# Altium schematic symbol library 13-Logicold 逻辑 IC.SchLib: 297 symbols (part 6 of 30) (continued)
## CY62167EV30LL-45ZXI (continued)
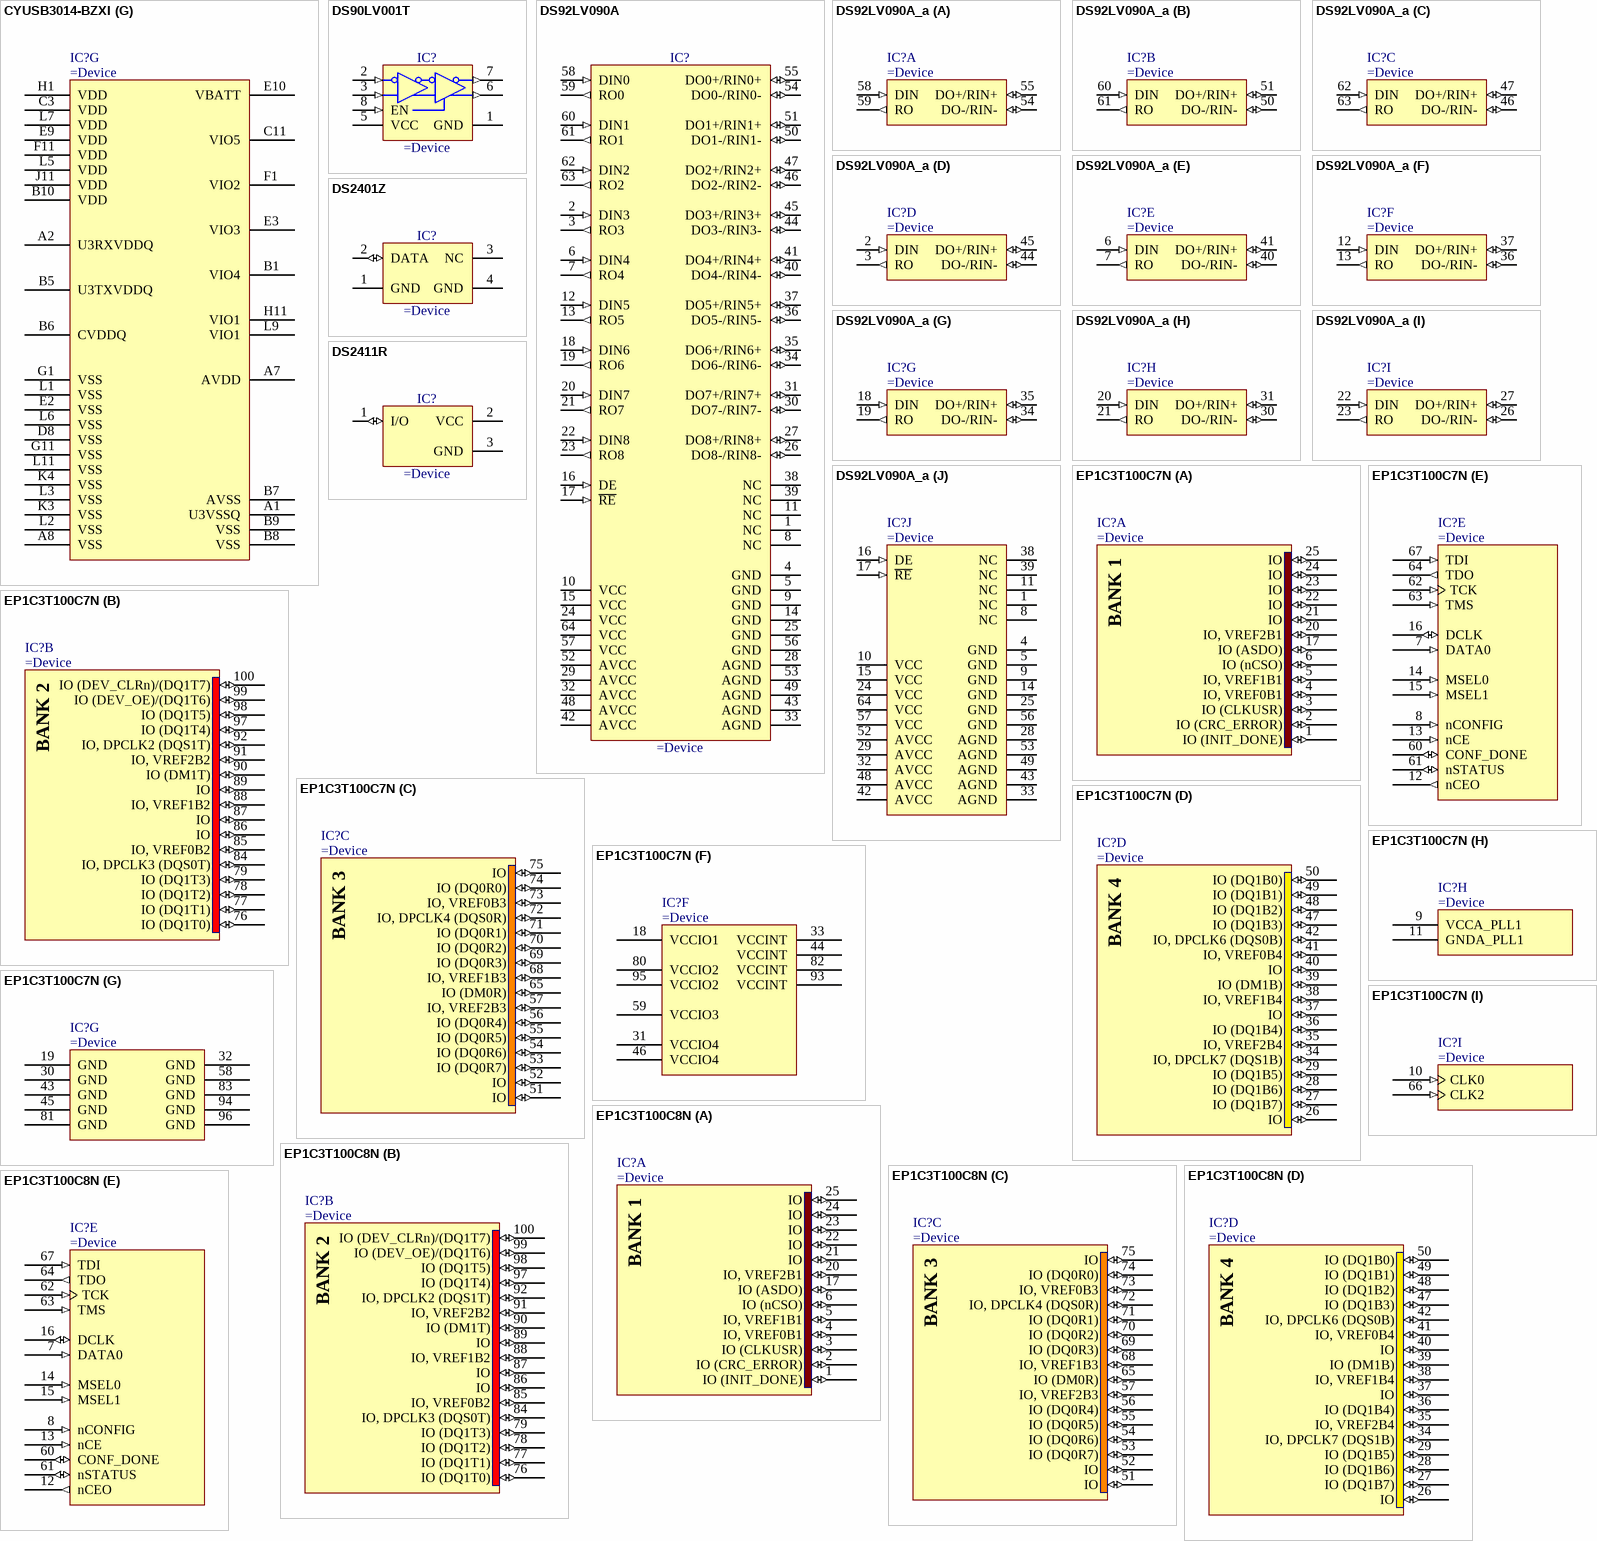
[diagram p34: symbols CYUSB3014-BZXI to EP1C3T100C8N]

## CYUSB3014-BZXI
designator IC?
EZ-USB® FX3 SuperSpeed USB Controller
part A pins: C5 ~{RESET} (in), F7 DQ2 (io), F8 DQ5 (io), F9 DQ1 (io), F10 DQ0 (io), G4 PMODE0 (io), G5 CTL8 (io), G6 CTL5 (io), G7 CTL4 (io), G8 DQ15 (io), G9 DQ4 (io), G10 DQ3 (io), H4 PMODE1 (io), H5 CTL12 (io), H6 CTL9 (io), H7 CTL3 (io), H8 CTL7 (io), H9 DQ7 (io), H10 DQ6 (io), J5 CTL11 (io), J6 PCLK (io), J7 CTL2 (io), J8 DQ14 (io), J9 DQ9 (io), J10 DQ8 (io), K5 CTL10 (io), K6 CTL6 (io), K7 CTL1 (io), K8 CTL0 (io), K9 DQ13 (io), K10 DQ12 (io), K11 DQ10 (io), L4 PMODE2 (io), L8 ~{INT}/CTL15 (io), L10 DQ11 (io)
part B pins: F2 GPIO45 (io), F3 DQ27 (io), F4 DQ24 (io), G2 DQ25 (io), G3 DQ26 (io), H2 DQ22 (io), H3 DQ23 (io), J1 DQ21 (io), J2 DQ19 (io), J3 DQ20 (io), J4 DQ17 (io), K1 DQ18 (io), K2 DQ16 (io)
part C pins: C1 UART_CTS/SPI_SSN (io), C2 UART_TX/SPI_MISO (io), C4 I2S_MCLK (io), D1 I2S_CLK (io), D2 I2S_SD (io), D3 I2S_WS (io), D4 UART_RTS/SPI_SCK (io), D5 UART_RX/SPI_MOSI (io), E1 DQ29 (io), E4 DQ31 (io), E5 DQ30 (io), F5 DQ28 (io)
part D pins: A3 SSRX- (in), A4 SSRX+ (in), A5 SSTX+ (out), A6 SSTX- (out), A9 D+ (io), A10 D- (io), A11 NC, B3 R_USB3 (io), C8 R_USB2 (io), C9 OTG_ID (in), E11 VBUS (power)
part E pins: B2 FSLC0 (in), B4 FSLC1 (in), C6 XTALIN (io), C7 XTALOUT (io), D6 CLKIN_32 (in), D7 CLKIN (in), E6 FSLC2 (in)
part F pins: B11 ~{TRST} (in), C10 TDO (out), D9 I2C_SCL (io), D10 I2C_SDA (io), D11 CHARGER-DET-OUT (io), E7 TDI (in), E8 TMS (in), F6 TCK (in)
part G pins: A1 U3VSSQ (power), A2 U3RXVDDQ (power), A7 AVDD (power), A8 VSS (power), B1 VIO4 (power), B5 U3TXVDDQ (power), B6 CVDDQ (power), B7 AVSS (power), B8 VSS (power), B9 VSS (power), B10 VDD (power), C3 VDD (power), C11 VIO5 (power), D8 VSS (power), E2 VSS (power), E3 VIO3 (power), E9 VDD (power), E10 VBATT (power), F1 VIO2 (power), F11 VDD (power), G1 VSS (power), G11 VSS (power), H1 VDD (power), H11 VIO1 (power), J11 VDD (power), K3 VSS (power), K4 VSS (power), L1 VSS (power), L2 VSS (power), L3 VSS (power), L5 VDD (power), L6 VSS (power), L7 VDD (power), L9 VIO1 (power), L11 VSS (power)

## DS90LV001T
designator IC?
800 Mbps LVDS Buffer
pins: 1 GND (power), 2 IN- (in), 3 IN+ (in), 5 VCC (power), 6 OUT+ (out), 7 OUT- (out), 8 EN (in)

## DS92LV090A
designator IC?
9 Channel Bus LVDS Transceiver
pins: 1 NC, 2 DIN3 (in), 3 RO3 (out), 4 GND (power), 5 GND (power), 6 DIN4 (in), 7 RO4 (out), 8 NC, 9 GND (power), 10 VCC (power), 11 NC, 12 DIN5 (in), 13 RO5 (out), 14 GND (power), 15 VCC (power), 16 DE (in), 17 ~{RE} (in), 18 DIN6 (in), 19 RO6 (out), 20 DIN7 (in), 21 RO7 (out), 22 DIN8 (in), 23 RO8 (out), 24 VCC (power), 25 GND (power), 26 DO8-/RIN8- (io), 27 DO8+/RIN8+ (io), 28 AGND (power), 29 AVCC (power), 30 DO7-/RIN7- (io), 31 DO7+/RIN7+ (io), 32 AVCC (power), 33 AGND (power), 34 DO6-/RIN6- (io), 35 DO6+/RIN6+ (io), 36 DO5-/RIN5- (io), 37 DO5+/RIN5+ (io), 38 NC, 39 NC, 40 DO4-/RIN4- (io), 41 DO4+/RIN4+ (io), 42 AVCC (power), 43 AGND (power), 44 DO3-/RIN3- (io), 45 DO3+/RIN3+ (io), 46 DO2-/RIN2- (io), 47 DO2+/RIN2+ (io), 48 AVCC (power), 49 AGND (power), 50 DO1-/RIN1- (io), 51 DO1+/RIN1+ (io), 52 AVCC (power), 53 AGND (power), 54 DO0-/RIN0- (io), 55 DO0+/RIN0+ (io), 56 GND (power), 57 VCC (power), 58 DIN0 (in), 59 RO0 (out), 60 DIN1 (in), 61 RO1 (out), 62 DIN2 (in), 63 RO2 (out), 64 VCC (power)

## DS92LV090A_a
designator IC?
9 Channel Bus LVDS Transceiver
part A pins: 54 DO-/RIN- (io), 55 DO+/RIN+ (io), 58 DIN (in), 59 RO (out)
part B pins: 50 DO-/RIN- (io), 51 DO+/RIN+ (io), 60 DIN (in), 61 RO (out)
part C pins: 46 DO-/RIN- (io), 47 DO+/RIN+ (io), 62 DIN (in), 63 RO (out)
part D pins: 2 DIN (in), 3 RO (out), 44 DO-/RIN- (io), 45 DO+/RIN+ (io)
part E pins: 6 DIN (in), 7 RO (out), 40 DO-/RIN- (io), 41 DO+/RIN+ (io)
part F pins: 12 DIN (in), 13 RO (out), 36 DO-/RIN- (io), 37 DO+/RIN+ (io)
part G pins: 18 DIN (in), 19 RO (out), 34 DO-/RIN- (io), 35 DO+/RIN+ (io)
part H pins: 20 DIN (in), 21 RO (out), 30 DO-/RIN- (io), 31 DO+/RIN+ (io)
part I pins: 22 DIN (in), 23 RO (out), 26 DO-/RIN- (io), 27 DO+/RIN+ (io)
part J pins: 1 NC, 4 GND (power), 5 GND (power), 8 NC, 9 GND (power), 10 VCC (power), 11 NC, 14 GND (power), 15 VCC (power), 16 DE (in), 17 ~{RE} (in), 24 VCC (power), 25 GND (power), 28 AGND (power), 29 AVCC (power), 32 AVCC (power), 33 AGND (power), 38 NC, 39 NC, 42 AVCC (power), 43 AGND (power), 48 AVCC (power), 49 AGND (power), 52 AVCC (power), 53 AGND (power), 56 GND (power), 57 VCC (power), 64 VCC (power)

## DS2401Z
designator IC?
Silicon Serial Number
pins: 1 GND (power), 2 DATA (io), 3 NC, 4 GND (power)

## DS2411R
designator IC?
Silicon Serial Number with VCC Input
pins: 1 I/O (io), 2 VCC (power), 3 GND (power)

## EP1C3T100C7N
designator IC?
Cyclone Family, 1.5V FPGA, 65 I/O Pins, 1 x PLL, Commercial Grade, Speed Grade 7, Pb-Free
part A pins: 1 IO (INIT_DONE) (io), 2 IO (CRC_ERROR) (io), 3 IO (CLKUSR) (io), 4 IO, VREF0B1 (io), 5 IO, VREF1B1 (io), 6 IO (nCSO) (io), 17 IO (ASDO) (io), 20 IO, VREF2B1 (io), 21 IO (io), 22 IO (io), 23 IO (io), 24 IO (io), 25 IO (io)
part B pins: 76 IO (DQ1T0) (io), 77 IO (DQ1T1) (io), 78 IO (DQ1T2) (io), 79 IO (DQ1T3) (io), 84 IO, DPCLK3 (DQS0T) (io), 85 IO, VREF0B2 (io), 86 IO (io), 87 IO (io), 88 IO, VREF1B2 (io), 89 IO (io), 90 IO (DM1T) (io), 91 IO, VREF2B2 (io), 92 IO, DPCLK2 (DQS1T) (io), 97 IO (DQ1T4) (io), 98 IO (DQ1T5) (io), 99 IO (DEV_OE)/(DQ1T6) (io), 100 IO (DEV_CLRn)/(DQ1T7) (io)
part C pins: 51 IO (io), 52 IO (io), 53 IO (DQ0R7) (io), 54 IO (DQ0R6) (io), 55 IO (DQ0R5) (io), 56 IO (DQ0R4) (io), 57 IO, VREF2B3 (io), 65 IO (DM0R) (io), 68 IO, VREF1B3 (io), 69 IO (DQ0R3) (io), 70 IO (DQ0R2) (io), 71 IO (DQ0R1) (io), 72 IO, DPCLK4 (DQS0R) (io), 73 IO, VREF0B3 (io), 74 IO (DQ0R0) (io), 75 IO (io)
part D pins: 26 IO (io), 27 IO (DQ1B7) (io), 28 IO (DQ1B6) (io), 29 IO (DQ1B5) (io), 34 IO, DPCLK7 (DQS1B) (io), 35 IO, VREF2B4 (io), 36 IO (DQ1B4) (io), 37 IO (io), 38 IO, VREF1B4 (io), 39 IO (DM1B) (io), 40 IO (io), 41 IO, VREF0B4 (io), 42 IO, DPCLK6 (DQS0B) (io), 47 IO (DQ1B3) (io), 48 IO (DQ1B2) (io), 49 IO (DQ1B1) (io), 50 IO (DQ1B0) (io)
part E pins: 7 DATA0 (in), 8 nCONFIG (in), 12 nCEO (out), 13 nCE (in), 14 MSEL0 (in), 15 MSEL1 (in), 16 DCLK (io), 60 CONF_DONE (io), 61 nSTATUS (io), 62 TCK (in), 63 TMS (in), 64 TDO (out), 67 TDI (in)
part F pins: 18 VCCIO1 (power), 31 VCCIO4 (power), 33 VCCINT (power), 44 VCCINT (power), 46 VCCIO4 (power), 59 VCCIO3 (power), 80 VCCIO2 (power), 82 VCCINT (power), 93 VCCINT (power), 95 VCCIO2 (power)
part G pins: 19 GND (power), 30 GND (power), 32 GND (power), 43 GND (power), 45 GND (power), 58 GND (power), 81 GND (power), 83 GND (power), 94 GND (power), 96 GND (power)
part H pins: 9 VCCA_PLL1 (power), 11 GNDA_PLL1 (power)
part I pins: 10 CLK0 (in), 66 CLK2 (in)
part A text: BANK 1
part B text: BANK 2
part C text: BANK 3
part D text: BANK 4

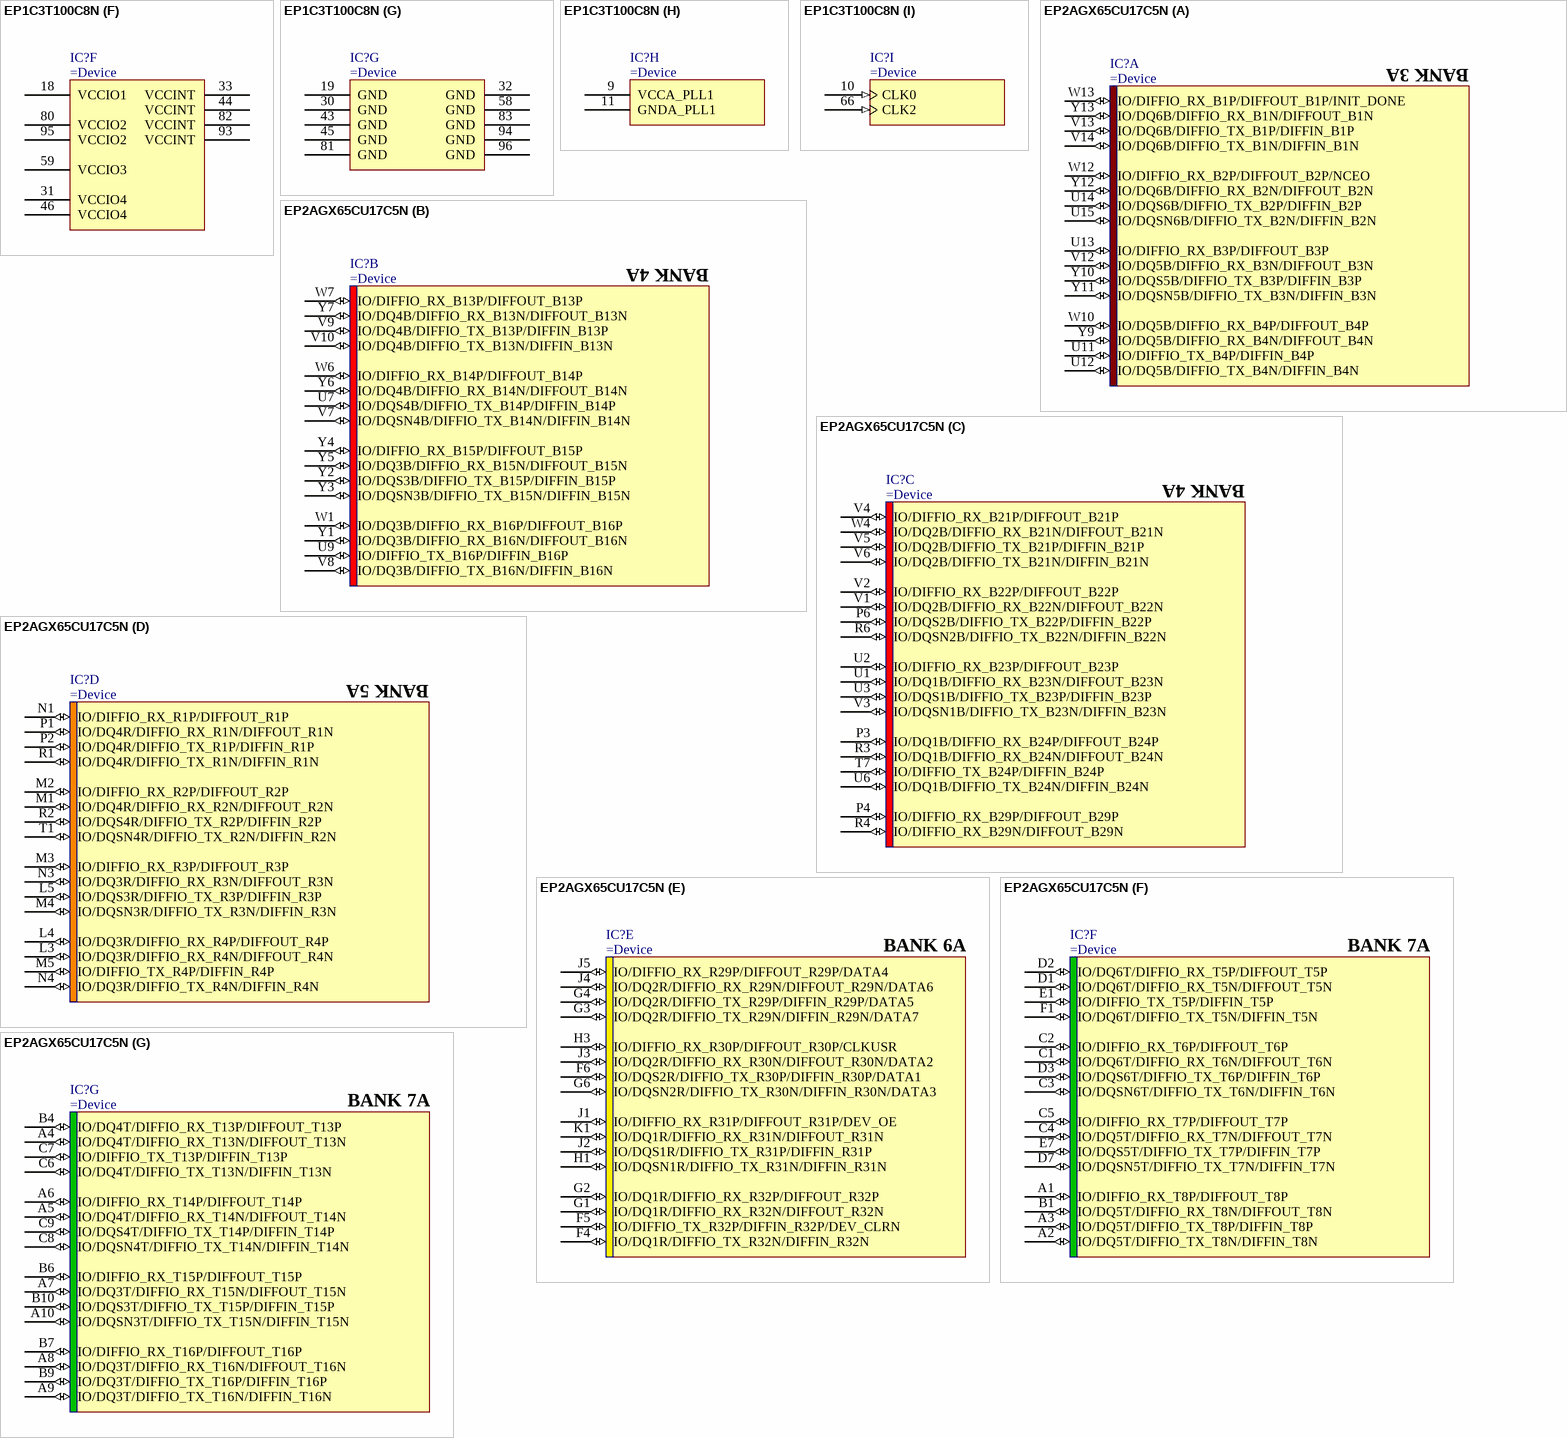
[diagram p35: symbols EP1C3T100C8N to EP2AGX65CU17C5N]

## EP1C3T100C8N
designator IC?
Cyclone Family, 1.5V FPGA, 65 I/O Pins, 1 x PLL, Commercial Grade, Speed Grade 8, Pb-Free
part A pins: 1 IO (INIT_DONE) (io), 2 IO (CRC_ERROR) (io), 3 IO (CLKUSR) (io), 4 IO, VREF0B1 (io), 5 IO, VREF1B1 (io), 6 IO (nCSO) (io), 17 IO (ASDO) (io), 20 IO, VREF2B1 (io), 21 IO (io), 22 IO (io), 23 IO (io), 24 IO (io), 25 IO (io)
part B pins: 76 IO (DQ1T0) (io), 77 IO (DQ1T1) (io), 78 IO (DQ1T2) (io), 79 IO (DQ1T3) (io), 84 IO, DPCLK3 (DQS0T) (io), 85 IO, VREF0B2 (io), 86 IO (io), 87 IO (io), 88 IO, VREF1B2 (io), 89 IO (io), 90 IO (DM1T) (io), 91 IO, VREF2B2 (io), 92 IO, DPCLK2 (DQS1T) (io), 97 IO (DQ1T4) (io), 98 IO (DQ1T5) (io), 99 IO (DEV_OE)/(DQ1T6) (io), 100 IO (DEV_CLRn)/(DQ1T7) (io)
part C pins: 51 IO (io), 52 IO (io), 53 IO (DQ0R7) (io), 54 IO (DQ0R6) (io), 55 IO (DQ0R5) (io), 56 IO (DQ0R4) (io), 57 IO, VREF2B3 (io), 65 IO (DM0R) (io), 68 IO, VREF1B3 (io), 69 IO (DQ0R3) (io), 70 IO (DQ0R2) (io), 71 IO (DQ0R1) (io), 72 IO, DPCLK4 (DQS0R) (io), 73 IO, VREF0B3 (io), 74 IO (DQ0R0) (io), 75 IO (io)
part D pins: 26 IO (io), 27 IO (DQ1B7) (io), 28 IO (DQ1B6) (io), 29 IO (DQ1B5) (io), 34 IO, DPCLK7 (DQS1B) (io), 35 IO, VREF2B4 (io), 36 IO (DQ1B4) (io), 37 IO (io), 38 IO, VREF1B4 (io), 39 IO (DM1B) (io), 40 IO (io), 41 IO, VREF0B4 (io), 42 IO, DPCLK6 (DQS0B) (io), 47 IO (DQ1B3) (io), 48 IO (DQ1B2) (io), 49 IO (DQ1B1) (io), 50 IO (DQ1B0) (io)
part E pins: 7 DATA0 (in), 8 nCONFIG (in), 12 nCEO (out), 13 nCE (in), 14 MSEL0 (in), 15 MSEL1 (in), 16 DCLK (io), 60 CONF_DONE (io), 61 nSTATUS (io), 62 TCK (in), 63 TMS (in), 64 TDO (out), 67 TDI (in)
part F pins: 18 VCCIO1 (power), 31 VCCIO4 (power), 33 VCCINT (power), 44 VCCINT (power), 46 VCCIO4 (power), 59 VCCIO3 (power), 80 VCCIO2 (power), 82 VCCINT (power), 93 VCCINT (power), 95 VCCIO2 (power)
part G pins: 19 GND (power), 30 GND (power), 32 GND (power), 43 GND (power), 45 GND (power), 58 GND (power), 81 GND (power), 83 GND (power), 94 GND (power), 96 GND (power)
part H pins: 9 VCCA_PLL1 (power), 11 GNDA_PLL1 (power)
part I pins: 10 CLK0 (in), 66 CLK2 (in)
